# Altium footprint library MyPcbLib.PcbLib: 278 footprints (part 17 of 18)
Each footprint in its own frame and in the unit in brackets; x right, y up, seen from the top. Pads: shape width x height; smd on the part's side, far side on the other; paste and mask are expansions set on the pad; w line width, h text height; cw(c..) or ccw(c..) is an arc to the next point about the centre after c.
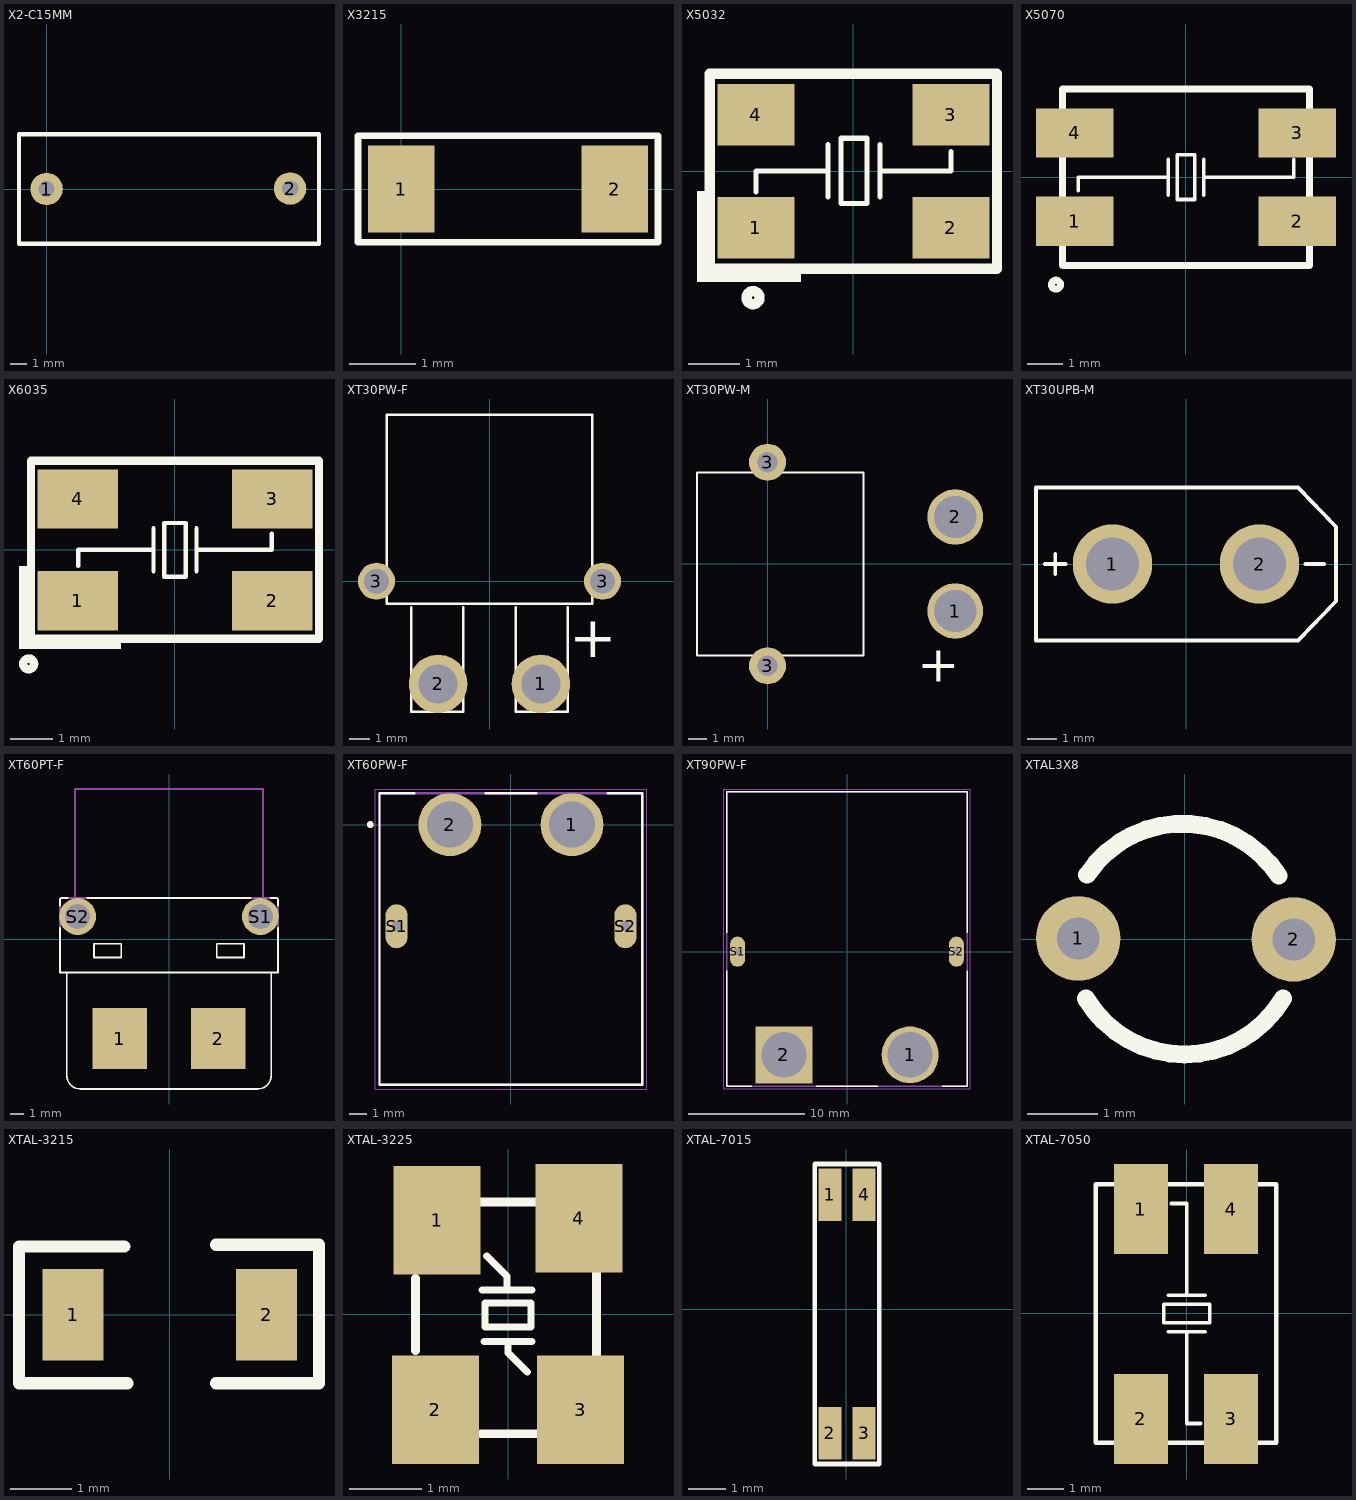
[diagram p16: the footprints below, top view; thin cyan lines are the x and y axes]

## X2-C15MM [mm] "18.25MM*11.4MM*5.78MM0.1UF 脚距15MM"
pads (2):
  round 2 hole 1: 1(0,0) 2(15.011,0.025)
Top Overlay:
  lines w0.254: -1.702,-3.378 -1.702,3.378 16.789,3.378 16.789,-3.378 -1.702,-3.378
3D body "X2-15MM.step": height 14, standoff -2.81, extent -1.431,-3.496 16.569,3.505

## X3215 [mm]
pads (2):
  rect 1x1.3 smd: 1(0,0) 2(3.2,0)
Top Overlay:
  lines w0.1: -0.65,-0.8 3.85,-0.8 3.85,0.8 -0.65,0.8 -0.65,-0.8
3D body "User Library-X3215.STEP": height 0.81, standoff 0, extent 0,-0.762 3.2,0.738

## X5032 [mm]
pads (4):
  rect 1.5x1.2 smd: 1(-1.9,-1.1) 2(1.9,-1.1) 3(1.9,1.1) 4(-1.9,1.1)
Top Overlay:
  circle w0.2: c-1.956,-2.464 r0.127
  rectangle: -3.023,-2.159 -1.016,-1.905
  rectangle: -3.048,-2.159 -2.87,-0.381
  lines w0.1: -1.897,-0.406 -1.897,0.008 -0.496,0.008 ; -0.496,-0.5 -0.496,0.516 ; 0.52,-0.5 0.52,0.516 ; 0.52,0.008 1.902,0.008 1.905,0.016 1.905,0.381 ; -0.242,-0.627 -0.242,0.643 0.266,0.643 0.266,0.326 0.266,-0.309 0.266,-0.627 -0.242,-0.627
  lines w0.2: -2.8,-1.9 2.8,-1.9 2.8,1.9 -2.8,1.9 -2.8,-1.9
3D body "User Library-CRYSTALSMD5X32.STEP": height 1, standoff 0, extent -2.5,-1.6 2.5,1.6

## X5070 [mm]
pads (4):
  rect 2.2x1.4 smd: 1(-3.15,-1.25) 2(3.15,-1.25) 3(3.15,1.25) 4(-3.15,1.25)
Top Overlay:
  circle w0.2: c-3.683,-3.048 r0.127
  lines w0.1: -3.048,-0.381 -3.048,0 -0.508,0 ; -0.508,-0.508 -0.508,0.508 ; 0.508,-0.508 0.508,0.508 ; 0.508,0 3.048,0 3.048,0.508 ; -0.254,-0.635 0.254,-0.635 0.254,0.635 -0.254,0.635 -0.254,-0.635
  lines w0.2: -3.5,-2.5 -3.5,2.5 3.5,2.5 3.5,-2.5 -3.5,-2.5
3D body "User Library-GeyerElectronics_KX13.STEP": height 1.31, standoff 0, extent -3.576,-2.54 3.424,2.46

## X6035 [mm]
pads (4):
  rect 1.9x1.4 smd: 1(-2.3,-1.2) 2(2.3,-1.2) 3(2.3,1.2) 4(-2.3,1.2)
Top Overlay:
  circle w0.2: c-3.454,-2.692 r0.127
  rectangle: -3.683,-2.337 -3.48,-0.381
  rectangle: -3.658,-2.337 -1.27,-2.108
  lines w0.1: -2.286,-0.381 -2.286,0 -2.032,0 -0.508,0 ; -0.508,-0.508 -0.508,0.508 ; 0.508,-0.508 0.508,0.508 ; 0.508,0 2.286,0 2.286,0.381 ; -0.254,-0.635 0.254,-0.635 0.254,0.635 -0.254,0.635 -0.254,-0.635
  lines w0.2: -3.4,-2.1 -3.4,2.1 3.4,2.1 3.4,-2.1 -3.4,-2.1
3D body "User Library-CRYSTALSMD5X32.STEP": height 1, standoff 0, extent -2.5,-1.6 2.5,1.6

## XT30PW-F [mm]
pads (4):
  round 2.85 hole 1.9: 1(2.5,-5) 2(-2.5,-5)
  round 1.8 hole 1.2: 3(-5.5,0) 3(5.5,0)
Top Overlay:
  lines w0.127: -3.81,-1.27 -3.81,-5.08 -3.81,-6.35 -1.27,-6.35 -1.27,-1.27 ; 1.27,-1.27 1.27,-6.35 3.81,-6.35 3.81,-1.27 ; -5,-1.1 -5,8.1 5,8.1 5,-1.1 -5,-1.1
  text "+" at 6.2,-3.7 h2

## XT30PW-M [mm]
height 1.524
pads (4):
  round 3 hole 2.286 paste+0 mask+0.05: 1(10.14,-2.54) 2(10.14,2.54)
  round 2 hole 1.1 paste+0 mask+0.05: 3(0,-5.5) 3(0,5.5)
Top Overlay:
  lines w0.1: -3.81,-4.95 -3.81,0 -3.81,4.95 5.19,4.95 5.19,-4.95 -3.81,-4.95
  text "+" at 10.394,-6.35 h2
3D body "XT30PW-M.STEP": height 4.55, standoff -2.65, extent -3.052,-6.65 10.898,6.65

## XT30UPB-M [mm]
pads (2):
  round 2.7 hole 1.8: 1(-2.5,0) 2(2.5,0)
Top Overlay:
  lines w0.127: -4.8,0 -4.1,0 ; -4.445,-0.35 -4.445,0.35 ; 4.064,0 4.699,0 ; -5.1,-2.6 3.81,-2.6 5.1,-1.27 5.1,1.27 3.81,2.6 -5.1,2.6 -5.1,-2.6

## XT60PT-F [mm]
pads (4):
  rect 4x4.5 smd: 1(-3.6,-7.3) 2(3.6,-7.3)
  round 2.7 hole 1.8 slot 1.8 at 0 deg: S1(6.7,1.65) S2(-6.7,1.65)
Top Overlay:
  lines w0.127: -8,0.8 -8,-2.45 -7.5,-2.45 ; -8,2.45 -8,2.9 cw(c-7.9,2.9) -7.9,3 -7.45,3 ; -7.5,-10 ccw(c-6.5,-10) -6.5,-11 6.5,-11 ccw(c6.5,-10) 7.5,-10 ; -7.5,-10 -7.5,-2.45 ; -6,3 6,3 ; 7.45,3 7.9,3 cw(c7.9,2.9) 8,2.9 8,2.45 ; 7.5,-10 7.5,-2.45 ; 8,0.8 8,-2.45 7.5,-2.45 ; -7.5,-2.45 7.5,-2.45 ; -5.5,-1.35 -5.5,-0.35 -3.5,-0.35 -3.5,-1.35 -5.5,-1.35 ; 3.5,-1.35 3.5,-0.35 5.5,-0.35 5.5,-1.35 3.5,-1.35
Mechanical 15:
  lines w0.127: -8,0.8 -8,2.45 ; -7.45,3 -6,3 ; -6.9,3 -6.9,11 6.9,11 6.9,3 ; 6,3 7.45,3 ; 8,0.8 8,2.45

## XT60PW-F [mm]
height 8.4
pads (4):
  round 3.716 hole 2.7: 1(3.6,0) 2(-3.6,0)
  oval 1.3x2.6 hole 0.6 square: S1(-6.75,-6) S2(6.75,-6)
Top Overlay:
  circle w0.2: c-8.3,0 r0.1
  lines w0.127: -5.71,1.85 -7.75,1.85 -7.75,-15.35 7.75,-15.35 7.75,1.85 5.71,1.85 ; -1.49,1.85 1.49,1.85
Mechanical 13:
  circle w0.2: c-8.3,0 r0.1
  lines w0.127: -7.75,-15.35 -7.75,1.85 7.75,1.85 7.75,-15.35 -7.75,-15.35
Mechanical 15:
  lines w0.05: -8,-15.6 -8,2.1 8,2.1 8,-15.6 -8,-15.6
3D body "step_temp.STEP": height 8.4, standoff -2.55, extent -7.75,-15.35 7.75,1.85

## XT90PW-F [mm]
pads (4):
  round 4.916 hole 3.9: 1(5.45,-8.9)
  rect 4.916x4.916 hole 3.9: 2(-5.45,-8.9)
  oval 1.3x2.6 hole 0.6 square: S1(-9.45,0) S2(9.45,0)
Top Overlay:
  lines w0.127: -10.4,-1.62 -10.4,-11.6 -8.228,-11.6 ; -10.4,1.62 -10.4,13.8 10.4,13.8 10.4,1.62 ; -2.672,-11.6 2.672,-11.6 ; 8.228,-11.6 10.4,-11.6 10.4,-1.62
Mechanical 13:
  lines w0.127: -10.4,-11.6 10.4,-11.6 10.4,13.8 -10.4,13.8 -10.4,-11.6
Mechanical 15:
  lines w0.05: -10.65,-11.85 -10.65,14.05 10.65,14.05 10.65,-11.85 -10.65,-11.85
3D body "step_temp.STEP": height 10.3, standoff -3.2, extent -10.75,-11.6 10.75,13.8

## XTAL3X8 [mm]
pads (2):
  round 1.2 hole 0.6: 1(-1.509,0.013) 2(1.55,0)
Top Overlay:
  lines w0.254: -1.4,-0.841 ccw(c-0.002,-0.002) 1.398,-0.839 ; -1.386,0.917 cw(c-0.029,0.013) 1.337,0.903
3D body "User Library-Crystal TH_.STEP": height 9.28, standoff -1.5, extent -1.707,-1.586 1.743,1.614

## XTAL-3215 [mm]
height 3.5
pads (2):
  rect 1x1.5 smd: 1(-1.581,0) 2(1.581,0)
Top Overlay:
  lines w0.2: -0.743,1.118 -2.464,1.118 -2.464,-1.118 -0.692,-1.118 ; 0.756,-1.118 2.438,-1.118 2.438,1.143 0.756,1.143
3D body "XTAL3215.step": height 0.81, standoff 0, extent -1.593,-0.75 1.607,0.75

## XTAL-3225 [mm]
pads (4):
  rect 1.2x1.5 smd: 1(-0.978,1.295) 2(-1.003,-1.321) 3(1.003,-1.321) 4(0.978,1.321)
Top Overlay:
  lines w0.1: -0.356,0.33 0.33,0.33 ; -0.33,-0.381 0.33,-0.381 ; -0.292,0.8 -0.013,0.521 -0.013,0.33 ; 0,-0.381 0,-0.533 0.267,-0.8 ; -0.318,-0.178 -0.318,0.152 0.318,0.152 0.318,-0.178 -0.318,-0.178
  lines w0.12: -1.278,-0.505 -1.278,0.495 ; -0.378,-1.655 0.422,-1.655 ; -0.378,1.545 0.422,1.545 ; 1.222,-0.605 1.222,0.595
3D body "XTAL-3225.STEP": height 0.8, standoff 0, extent -1.268,-1.651 1.232,1.549

## XTAL-7015 [mil]
pads (4):
  rect 23.62x55 smd: 1(-17,119) 2(-17,-129.03) 3(18.43,-129.03) 4(18.43,119)
Top Overlay:
  lines w4.72: -32.75,-161 34.18,-161 34.18,151 -32.75,151 -32.75,-161
3D body "xtal6713.STEP": height 51.18, standoff 0, extent -25,-148.9 26.18,136.9

## XTAL-7050 [mm]
pads (4):
  rect 1.5x2.5 smd: 1(-1.27,2.894) 2(-1.27,-2.922) 3(1.23,-2.922) 4(1.23,2.894)
Top Overlay:
  lines w0.1: -0.508,-0.508 0.508,-0.508 ; -0.508,0.508 0.508,0.508 ; -0.432,3.048 0,3.048 0,0.508 ; 0,-0.508 0,-3.048 0.381,-3.048 ; -0.635,-0.254 -0.635,0.254 0.635,0.254 0.635,-0.254 -0.635,-0.254
  lines w0.12: -2.52,-3.581 -2.52,3.581 2.48,3.581 2.48,-3.581 -2.52,-3.581
3D body "XTAL-7050.STEP": height 1, standoff 0, extent -2.5,-3.449 2.5,3.551